# Altium footprint library USBes.PcbLib: 65 footprints (part 1 of 5)
Each footprint in its own frame and in the unit in brackets; x right, y up, seen from the top. Pads: shape width x height; smd on the part's side, far side on the other; paste and mask are expansions set on the pad; w line width, h text height; cw(c..) or ccw(c..) is an arc to the next point about the centre after c.
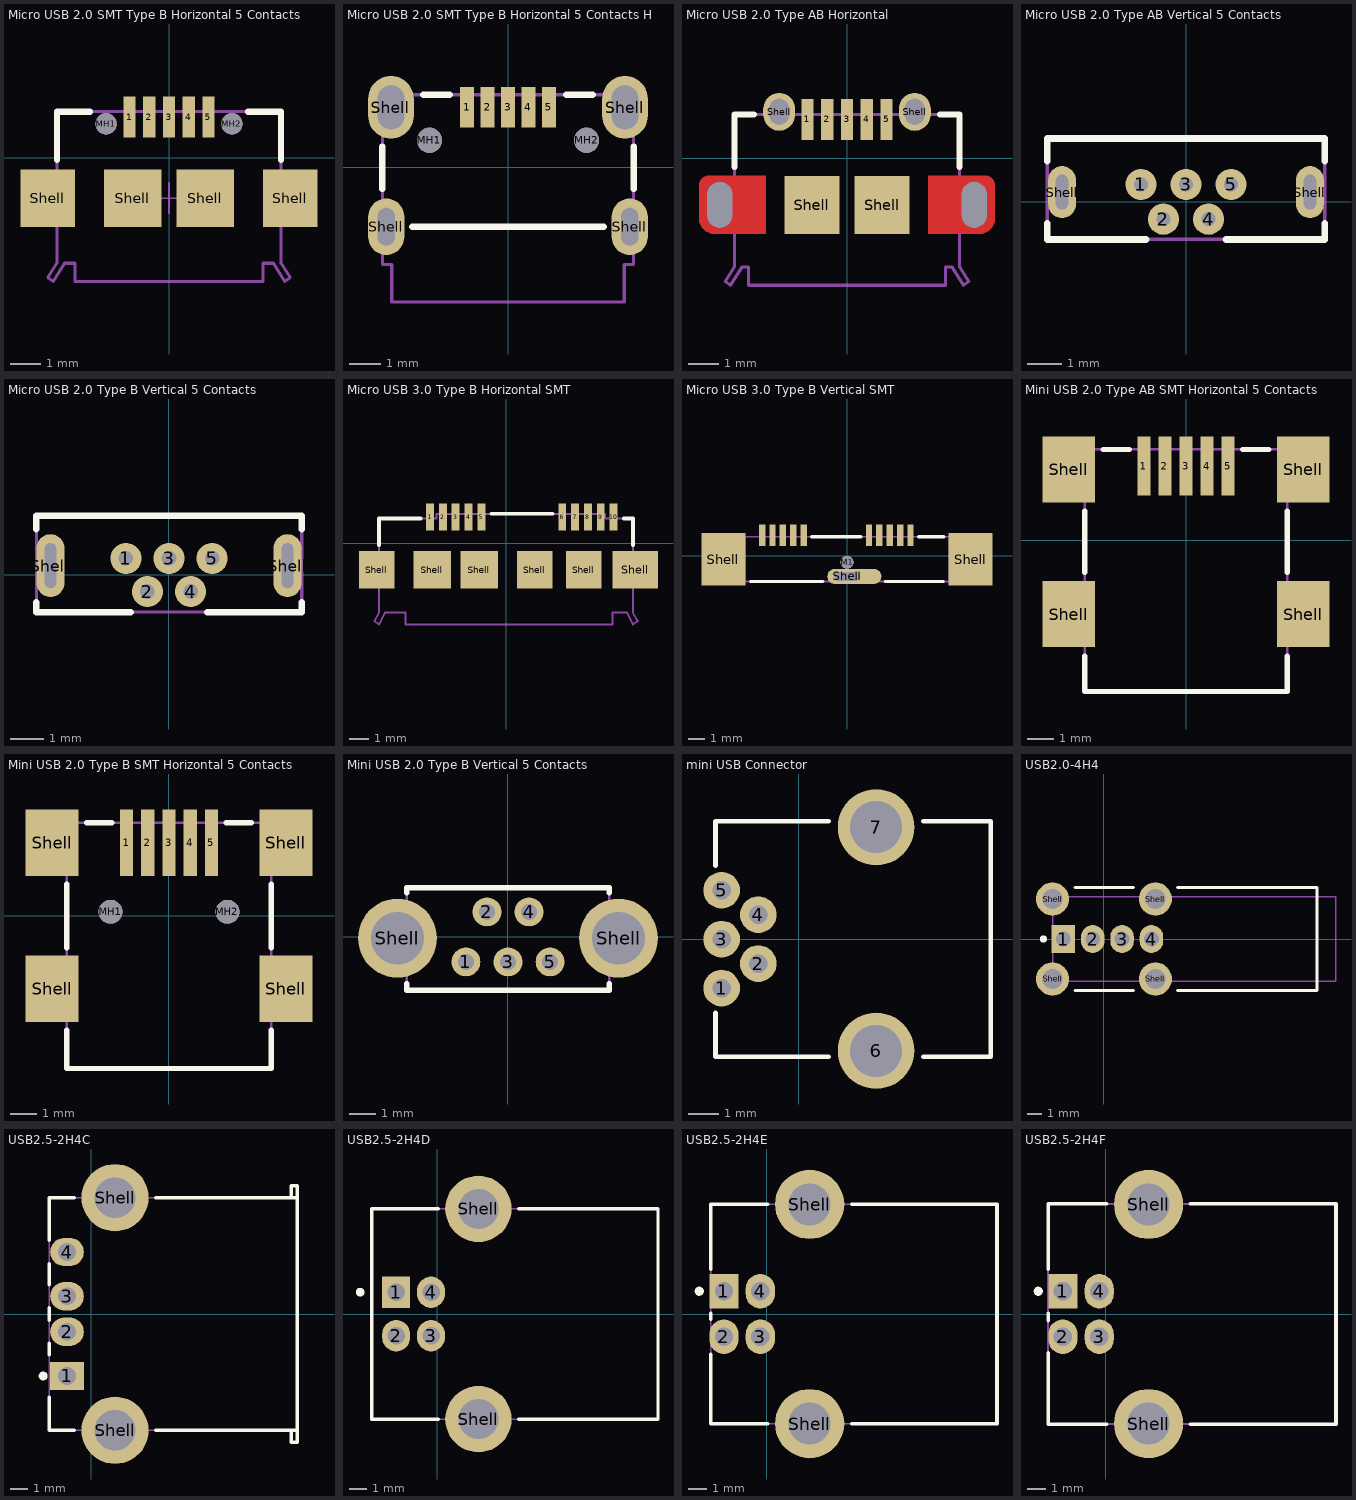
[diagram p0: the footprints below, top view; thin cyan lines are the x and y axes]

## Micro USB 2.0 SMT Type B Horizontal 5 Contacts [mm] "Micro USB 2.0 SMT Type B Horizontal 5 Contacts"
height 3
pads (11):
  rect 0.4x1.35 smd: 1(-1.3,1.338) 2(-0.65,1.338) 3(0,1.338) 4(0.65,1.338) 5(1.3,1.338)
  round 0.7 hole 0.7 unplated: MH1(-2.075,1.113) MH2(2.075,1.113)
  rect 1.8x1.9 smd: Shell(-4,-1.337) Shell(4,-1.337)
  rect 1.9x1.9 smd: Shell(-1.2,-1.337) Shell(1.2,-1.337)
Top Overlay:
  lines w0.2: -3.7,-0.087 -3.7,1.513 -2.6,1.513 ; 2.6,1.513 3.7,1.513 3.7,-0.087
Mechanical 13:
  lines w0.1: -1.425,1.513 -1.425,1.813 -1.175,1.813 -1.175,1.513 ; -0.775,1.513 -0.775,1.813 -0.525,1.813 -0.525,1.513 ; -0.125,1.513 -0.125,1.813 0.125,1.813 0.125,1.513 ; 0.525,1.513 0.525,1.813 0.775,1.813 0.775,1.513 ; 1.175,1.513 1.175,1.813 1.425,1.813 1.425,1.513 ; -4,-3.962 -3.7,-3.487 -3.7,1.513 3.7,1.513 3.7,-3.487 4,-3.962 3.825,-4.087 3.45,-3.487 3.1,-3.487 3.1,-4.087 -3.1,-4.087 -3.1,-3.487 -3.45,-3.487 -3.825,-4.087 -4,-3.962
Mechanical 15:
  lines w0.05: -0.5,-1.337 0.5,-1.337 ; 0,-1.837 0,-0.837
3D body "629105136821.stp": height 2.69, standoff -0.61, extent -4,-4.068 4,1.836

## Micro USB 2.0 SMT Type B Horizontal 5 Contacts High Current [mm] "Micro USB 2.0 SMT Type B Horizontal 5 Contacts High Current"
height 2.66
pads (11):
  rect 0.45x1.3 smd: 1(-1.3,1.9) 2(-0.65,1.9) 3(0,1.9) 4(0.65,1.9) 5(1.3,1.9)
  round 0.8 hole 0.8 unplated: MH1(-2.5,0.85) MH2(2.5,0.85)
  oval 1.15x1.8 hole 0.55 slot 1.2 at 90 deg: Shell(-3.875,-1.9) Shell(3.875,-1.9)
  oval 1.45x2 hole 0.85 slot 1.4 at 90 deg: Shell(-3.725,1.9) Shell(3.725,1.9)
Top Overlay:
  lines w0.2: -4,-0.7 -4,0.65 ; -3.048,-1.9 3.048,-1.9 ; -2.7,2.3 -1.85,2.3 ; 1.85,2.3 2.7,2.3 ; 4,-0.7 4,0.65
Mechanical 13:
  lines w0.1: -4,-3.1 -3.7,-3.1 -3.7,-4.3 3.7,-4.3 3.7,-3.1 4,-3.1 4,2.3 -4,2.3 -4,-3.1
3D body "629105150521.stp": height 2.75, standoff -1.77, extent -4,-4.3 4,2.303

## Micro USB 2.0 Type AB Horizontal [mm] "Micro USB 2.0 Type AB Horizontal"
height 3
pads (11):
  rect 0.4x1.35 smd: 1(-1.3,1.278) 2(-0.65,1.278) 3(0,1.278) 4(0.65,1.278) 5(1.3,1.278)
  round 0 hole 0.825 slot 1.5 at 90 deg: Shell(-4.175,-1.528) Shell(4.175,-1.528)
  oval 1.05x1.25 hole 0.65 slot 0.85 at 90 deg: Shell(-2.225,1.528) Shell(2.225,1.528)
  rect 1.8x1.9 smd: Shell(-1.15,-1.528) Shell(1.15,-1.528)
Top Layer:
  region: 4.353,-2.478 4.452,-2.478 4.636,-2.401 4.776,-2.261 4.852,-2.077 4.852,-1.978 4.852,-0.877 4.852,-0.818 4.807,-0.708 4.722,-0.623 4.612,-0.577 4.553,-0.577 2.668,-0.577 2.668,-2.478
  region: -4.353,-2.478 -4.452,-2.478 -4.636,-2.401 -4.776,-2.261 -4.852,-2.077 -4.852,-1.978 -4.852,-0.877 -4.852,-0.818 -4.807,-0.708 -4.722,-0.623 -4.612,-0.577 -4.553,-0.577 -2.668,-0.577 -2.668,-2.478
Top Overlay:
  lines w0.2: -3.7,-0.278 -3.7,1.442 -3.05,1.442 ; 3.05,1.442 3.7,1.442 3.7,-0.278
Mechanical 13:
  lines w0.1: -4,-4.042 -3.7,-3.568 -3.7,1.442 3.7,1.442 3.7,-3.568 4,-4.042 3.825,-4.167 3.45,-3.568 3.24,-3.568 3.24,-4.167 -3.24,-4.167 -3.24,-3.568 -3.45,-3.568 -3.825,-4.167 -4,-4.042
3D body "629105150921.stp": height 2.76, standoff -0.52, extent -4.3,-4.168 4.3,1.702

## Micro USB 2.0 Type AB Vertical 5 Contacts [mm] "Micro USB 2.0 Type AB Vertical 5 Contacts"
height 5.61
pads (7):
  round 0.9 hole 0.4: 1(-1.3,0.5) 2(-0.65,-0.5) 3(0,0.5) 4(0.65,-0.5) 5(1.3,0.5)
  oval 0.8x1.5 hole 0.35 slot 1 at 90 deg: Shell(-3.575,0.28) Shell(3.575,0.28)
Top Overlay:
  lines w0.2: -4,-0.62 -4,-1.08 -1.15,-1.08 ; -4,1.18 -4,1.82 4,1.82 4,1.18 ; 1.15,-1.08 4,-1.08 4,-0.62
Mechanical 13:
  lines w0.1: -4,-1.08 4,-1.08 4,1.82 -4,1.82 -4,-1.08
3D body "614105150621.stp": height 5.66, standoff -1.45, extent -4,-1.08 4,1.82

## Micro USB 2.0 Type B Vertical 5 Contacts [mm] "Micro USB 2.0 Type B Vertical 5 Contacts"
height 5.61
pads (7):
  round 0.94 hole 0.44: 1(-1.3,0.5) 2(-0.65,-0.5) 3(0,0.5) 4(0.65,-0.5) 5(1.3,0.5)
  oval 0.85x1.9 hole 0.35 slot 1.35 at 90 deg: Shell(-3.575,0.28) Shell(3.575,0.28)
Top Overlay:
  lines w0.2: -4,-0.82 -4,-1.12 -1.15,-1.12 ; -4,1.38 -4,1.78 4,1.78 4,1.38 ; 1.15,-1.12 4,-1.12 4,-0.82
Mechanical 13:
  lines w0.1: -4,-1.12 4,-1.12 4,1.78 -4,1.78 -4,-1.12
3D body "614105150721.stp": height 5.64, standoff -1.81, extent -4,-1.12 4,1.78

## Micro USB 3.0 Type B Horizontal SMT [mm] "Micro USB 3.0 Type B Horizontal SMT"
height 2.58
pads (16):
  rect 0.4x1.35 smd: 1(-3.85,1.338) 2(-3.2,1.338) 3(-2.55,1.338) 4(-1.9,1.338) 5(-1.25,1.338) 6(2.85,1.338) 7(3.5,1.338) 8(4.15,1.338) 9(4.8,1.338) 10(5.45,1.338)
  rect 1.8x1.9 smd: Shell(-6.55,-1.337) Shell(1.45,-1.337) Shell(3.95,-1.337)
  rect 1.9x1.9 smd: Shell(-3.75,-1.337) Shell(-1.35,-1.337)
  rect 2.3x1.9 smd: Shell(6.55,-1.337)
Top Overlay:
  lines w0.2: -6.425,-0.092 -6.425,1.253 -4.33,1.253 ; -0.73,1.503 2.35,1.503 ; 5.97,1.253 6.425,1.253 6.425,-0.092
Mechanical 13:
  lines w0.1: -6.675,-3.937 -6.425,-3.497 -6.425,1.253 -3.53,1.253 -3.53,1.503 5.02,1.503 5.02,1.253 6.425,1.253 6.425,-3.497 6.675,-3.937 6.425,-4.097 6.125,-3.497 5.385,-3.497 5.385,-4.097 -5.085,-4.097 -5.085,-3.497 -6.125,-3.497 -6.425,-4.097 -6.675,-3.937
3D body "692622030100.stp": height 2.77, standoff -0.18, extent -6.55,-4.088 7.192,1.514

## Micro USB 3.0 Type B Vertical SMT [mm] "Micro USB 3.0 Type B Vertical SMT"
height 5.15
pads (14):
  rect 0.4x1.35 smd: 1(3.98,1.29) 2(3.33,1.29) 3(2.68,1.29) 4(2.03,1.29) 5(1.38,1.29) 6(-2.72,1.29) 7(-3.37,1.29) 8(-4.02,1.29) 9(-4.67,1.29) 10(-5.32,1.29)
  round 0.8 hole 0.8 unplated: M1(0,-0.4)
  rect 2.75x3.3 smd: Shell(-7.75,-0.21) Shell(7.75,-0.21)
  oval 3.4x0.95 hole 0.55 slot 1.6 at 0 deg copper offset 0.46,0: Shell(0,-1.29)
Top Overlay:
  lines w0.2: -6.05,-1.61 -1.5,-1.61 ; -2.225,1.19 0.875,1.19 ; 2.4,-1.61 6.05,-1.61 ; 4.475,1.19 6.075,1.19
Mechanical 13:
  lines w0.1: -6.425,-1.61 -6.425,1.19 6.425,1.19 6.425,-1.61 -6.425,-1.61
3D body "692622420101.stp": height 5.82, standoff -0.83, extent -8.7,-1.8 8.7,1.7

## Mini USB 2.0 Type AB SMT Horizontal 5 Contacts [mm] "Mini USB 2.0 Type AB SMT Horizontal 5 Contacts"
height 4
pads (9):
  rect 0.5x2.25 smd: 1(-1.6,2.813) 2(-0.8,2.813) 3(0,2.813) 4(0.8,2.813) 5(1.6,2.813)
  rect 2x2.5 smd: Shell(-4.45,-2.812) Shell(-4.45,2.688) Shell(4.45,-2.812) Shell(4.45,2.688)
Top Overlay:
  lines w0.2: -3.85,-4.402 -3.85,-5.752 3.85,-5.752 3.85,-4.402 ; -3.85,-1.222 -3.85,1.098 ; -3.15,3.447 -2.15,3.447 ; 2.15,3.447 3.15,3.447 ; 3.85,-1.222 3.85,1.098
Mechanical 13:
  lines w0.1: -3.85,-5.752 3.85,-5.752 3.85,3.447 -3.85,3.447 -3.85,-5.752
3D body "651305142821.stp": height 4.1, standoff 0, extent -4.95,-5.753 4.95,3.647

## Mini USB 2.0 Type B SMT Horizontal 5 Contacts [mm] "Mini USB 2.0 Type B SMT Horizontal 5 Contacts"
height 3.9
pads (11):
  rect 0.5x2.5 smd: 1(-1.6,2.75) 2(-0.8,2.75) 3(0,2.75) 4(0.8,2.75) 5(1.6,2.75)
  round 0.9 hole 0.9 unplated: MH1(-2.2,0.15) MH2(2.2,0.15)
  rect 2x2.5 smd: Shell(-4.4,-2.75) Shell(-4.4,2.75) Shell(4.4,-2.75) Shell(4.4,2.75)
Top Overlay:
  lines w0.2: -3.85,-4.3 -3.85,-5.75 3.85,-5.75 3.85,-4.3 ; -3.85,-1.2 -3.85,1.2 ; -3.1,3.5 -2.15,3.5 ; 2.15,3.5 3.1,3.5 ; 3.85,-1.2 3.85,1.2
Mechanical 13:
  lines w0.1: -3.85,-5.75 -3.85,3.5 3.85,3.5 3.85,-5.75 -3.85,-5.75
3D body "65100516121.stp": height 3.92, standoff -0.98, extent -4.8,-5.75 4.8,3.5

## Mini USB 2.0 Type B Vertical 5 Contacts [mm] "Mini USB 2.0 Type B Vertical 5 Contacts"
height 9.2
pads (7):
  round 1.1 hole 0.6: 1(-1.6,-0.95) 2(-0.8,0.95) 3(0,-0.95) 4(0.8,0.95) 5(1.6,-0.95)
  round 3 hole 2: Shell(-4.2,-0.05) Shell(4.2,-0.05)
Top Overlay:
  lines w0.2: -3.85,-1.78 -3.85,-2.03 3.85,-2.03 3.85,-1.78 ; -3.85,1.67 -3.85,1.87 3.85,1.87 3.85,1.67
Mechanical 13:
  lines w0.1: -3.85,-2.03 -3.85,1.87 3.85,1.87 3.85,-2.03 -3.85,-2.03
3D body "651005136421.stp": height 9.4, standoff -2.6, extent -5.099,-2 5.099,1.9

## mini USB Connector [mm]
pads (7):
  round 1.2 hole 0.6: 1(-2.525,-1.605) 2(-1.325,-0.805) 3(-2.525,-0.005) 4(-1.325,0.795) 5(-2.525,1.595)
  round 2.5 hole 1.7: 6(2.525,-3.655) 7(2.525,3.655)
Top Overlay:
  lines w0.15: -2.725,-2.405 -2.725,-3.855 0.975,-3.855 ; -2.725,2.395 -2.725,3.845 0.975,3.845 ; 4.075,-3.855 6.275,-3.855 6.275,3.845 4.075,3.845
3D body "5877.STEP": height 3.95, standoff -1.8, extent -2.725,-3.855 6.275,3.845

## USB2.0-4H4 [mm] "Connector; USB1.1, Type A, Thru-Hole; 4 Position; Right Angle"
height 13.83
pads (8):
  rect 1.6x1.9 hole 1: 1(-2.77,0)
  oval 1.6x1.9 hole 1: 2(-0.77,0) 3(1.23,0) 4(3.23,0)
  round 2.25 hole 1.35: Shell(-3.5,-2.72) Shell(-3.5,2.72) Shell(3.5,-2.72) Shell(3.5,2.72)
Top Overlay:
  circle w0.25: c-4.12,0 r0.125
  lines w0.2: -1.98,-3.5 2,-3.5 ; -1.98,3.5 2,3.5 ; 5.01,-3.5 14.5,-3.5 14.5,3.5 5.01,3.5
Mechanical 13:
  lines w0.1: -3.5,-2.88 -3.5,2.88 15.79,2.88 15.79,-2.88 -3.5,-2.88
3D body "usb_a-usb_a-e.stp": height 14.25, standoff -3.9, extent -3.995,-3.564 15.255,3.556

## USB2.5-2H4C [mm] "Connector; USB1.1, Type A, Thru-Hole; 4 Position; Right Angle"
height 7.01
pads (6):
  rect 1.9x1.6 hole 1: 1(-1.355,-3.5)
  oval 1.9x1.6 hole 1: 2(-1.355,-1) 3(-1.355,1) 4(-1.355,3.5)
  round 3.8 hole 2.3: Shell(1.355,-6.57) Shell(1.355,6.57)
Top Overlay:
  circle w0.25: c-2.705,-3.5 r0.125
  lines w0.2: -2.365,-4.7 -2.365,-6.565 -0.945,-6.565 ; -2.365,-2.3 -2.365,-1.66 ; -2.365,-0.34 -2.365,0.34 ; -2.365,1.66 -2.365,2.84 ; -2.365,4.16 -2.365,6.565 -0.945,6.565 ; 3.655,-6.565 11.635,-6.565 ; 3.655,6.565 11.635,6.565 ; 11.315,-6.565 11.315,-7.25 11.635,-7.25 11.635,-6.565 ; 11.315,6.565 11.315,7.25 11.635,7.25 11.635,6.565 ; 11.635,-6.565 11.635,6.565
Mechanical 13:
  lines w0.1: -2.365,-6.565 -2.365,6.565 11.315,6.565 11.315,7.25 11.635,7.25 11.635,-7.25 11.315,-7.25 11.315,-6.565 -2.365,-6.565
3D body "14388.STEP": height 7.35, standoff -3.5, extent -2.767,-7.9 11.733,7.9

## USB2.5-2H4D [mm] "Connector; USB1.1, Type B, Thru-Hole; 4 Position; Right Angle"
height 11.1
pads (6):
  rect 1.6x1.8 hole 1: 1(-2.355,1.25)
  oval 1.6x1.8 hole 1: 2(-2.355,-1.25) 3(-0.355,-1.25) 4(-0.355,1.25)
  round 3.8 hole 2.3: Shell(2.355,-6.02) Shell(2.355,6.02)
Top Overlay:
  circle w0.25: c-4.415,1.25 r0.125
  lines w0.2: 0.055,-6.02 -3.765,-6.02 -3.765,6.02 0.055,6.02 ; 4.655,-6.02 12.635,-6.02 12.635,6.02 4.655,6.02
Mechanical 13:
  lines w0.1: -3.765,-6.02 -3.765,6.02 12.635,6.02 12.635,-6.02 -3.765,-6.02
3D body "Samtec-DEFAULT.STEP": height 11.05, standoff 0.55, extent 2.582,-5.625 68.532,5.575
3D body "14389.STEP": height 10.95, standoff -3.7, extent -3.855,-7.45 12.645,7.448

## USB2.5-2H4E [mm] "Connector; USB1.1, Type B, Thru-Hole; 4 Position; Right Angle"
height 11.5
pads (6):
  rect 1.6x1.9 hole 1: 1(-2.355,1.25)
  oval 1.6x1.9 hole 1: 2(-2.355,-1.25) 3(-0.355,-1.25) 4(-0.355,1.25)
  round 3.8 hole 2.3: Shell(2.355,-6.02) Shell(2.355,6.02)
Top Overlay:
  circle w0.25: c-3.705,1.25 r0.125
  lines w0.2: -3.075,-2.21 -3.075,-6.02 0.055,-6.02 ; -3.075,-0.29 -3.075,0.05 ; -3.075,2.45 -3.075,6.02 0.055,6.02 ; 4.655,-6.02 12.635,-6.02 12.635,6.02 4.655,6.02
Mechanical 13:
  lines w0.1: -3.075,-6.02 -3.075,6.02 12.635,6.02 12.635,-6.02 -3.075,-6.02
3D body "14389.STEP": height 10.95, standoff -3.7, extent -3.855,-7.45 12.645,7.448

## USB2.5-2H4F [mm] "Connector; USB1.1, Type B, Thru-Hole; 4 Position; Right Angl"
height 10.95
pads (6):
  rect 1.6x1.9 hole 1: 1(-2.355,1.25)
  oval 1.6x1.9 hole 1: 2(-2.355,-1.25) 3(-0.355,-1.25) 4(-0.355,1.25)
  round 3.8 hole 2.3: Shell(2.355,-6.02) Shell(2.355,6.02)
Top Overlay:
  circle w0.25: c-3.705,1.25 r0.125
  lines w0.2: -3.165,-2.14 -3.165,-6.05 0.055,-6.05 ; -3.165,-0.36 -3.165,0.05 ; -3.165,2.45 -3.165,6.05 0.055,6.05 ; 4.655,-6.05 12.635,-6.05 ; 4.655,6.05 12.635,6.05 ; 12.655,-6.05 12.655,6.05
Mechanical 13:
  lines w0.1: -3.165,-6.05 -3.165,6.05 12.635,6.05 12.635,-6.05 -3.165,-6.05
3D body "14389.STEP": height 10.95, standoff -3.7, extent -3.855,-7.45 12.645,7.448